# Altium schematic symbol library TI Power Management Shunt Voltage Reference.SchLib: 1526 symbols (part 7 of 18) (continued)
## LT1009CPWR
designator U?
Integrated Reference Circuit, 2.5 V, 15 ppm / degC, 10 mA, 0 to 70 degC, 8-pin TSSOP (PW), Green (RoHS & no Sb/Br); Manufacturer: Texas Instruments; PartNumber: LT1009CPWR; Initial Accuracy @ 25/deg C(%): 0.2; Iout/Iz(Max)(mA): 10; Min Iz for Regulation(uA): 400; Rating: Catalog; SubFamily: Shunt Voltage Reference; Temp Coeff(Max)(ppm/ degree C): 25; Temp Coeff(Typ)(ppm/ degree C): 15; VO(V): 2.5; DatasheetVersion: SLVS013N; PackageVersion: 4040064-2/G; PackageReference: PW8; PackageDescription: 8-Pin Plastic Small Outline, Body 4.4 x 3 mm, Pitch 0.65 mm; Supplier 1: Digi-Key; Supplier Part Number 1: 296-13081-2-ND; Supplier 2: Digi-Key; Supplier Part Number 2: 296-13081-1-ND; Supplier 3: Digi-Key; Supplier Part Number 3: 296-13081-6-ND; Supplier 4: Newark; Supplier Part Number 4: 75C0928; Supplier 5: Mouser; Supplier Part Number 5: 595-LT1009CPWR; Eco-Plan: Green (RoHS & no Sb/Br); Mounting Technology: Surface Mount; Code_JEDEC: MO-153; ComponentLink1Description: Manufacturer URL; ComponentLink1URL: http://www.ti.com/; ComponentLink2Description: Datasheet; ComponentLink2URL: http://www.ti.com/general/docs/lit/getliterature.tsp?genericPartNumber=LT1009&fileType=pdf; ComponentLink3Description: Package Specification; ComponentLink3URL: http://www.ti.com/litv/pdf/mtss001d
footprint TI-PW8_N (SOP, 8-Leads, Body 4.4x3mm, Pitch 0.65mm, IPC Medium Density)
part A pins: 4 ANODE, 5 ADJ (in), 6 CATHODE, 8 CATHODE
part B pins: 1 NC "No internal connection", 2 NC "No internal connection", 3 NC "No internal connection", 7 NC "No internal connection"

## LT1009CPWRE4
designator U?
Integrated Reference Circuit, 2.5 V, 15 ppm / degC, 10 mA, 0 to 70 degC, 8-pin TSSOP (PW), Green (RoHS & no Sb/Br); Manufacturer: Texas Instruments; PartNumber: LT1009CPWRE4; Initial Accuracy @ 25/deg C(%): 0.2; Iout/Iz(Max)(mA): 10; Min Iz for Regulation(uA): 400; Rating: Catalog; SubFamily: Shunt Voltage Reference; Temp Coeff(Max)(ppm/ degree C): 25; Temp Coeff(Typ)(ppm/ degree C): 15; VO(V): 2.5; DatasheetVersion: SLVS013N; PackageVersion: 4040064-2/G; PackageReference: PW8; PackageDescription: 8-Pin Plastic Small Outline, Body 4.4 x 3 mm, Pitch 0.65 mm; Supplier 1: Digi-Key; Supplier Part Number 1: LT1009CPWRE4-ND; Supplier 2: Mouser; Supplier Part Number 2: 595-LT1009CPWRE4; Eco-Plan: Green (RoHS & no Sb/Br); Mounting Technology: Surface Mount; Code_JEDEC: MO-153; ComponentLink1Description: Manufacturer URL; ComponentLink1URL: http://www.ti.com/; ComponentLink2Description: Datasheet; ComponentLink2URL: http://www.ti.com/general/docs/lit/getliterature.tsp?genericPartNumber=LT1009&fileType=pdf; ComponentLink3Description: Package Specification; ComponentLink3URL: http://www.ti.com/litv/pdf/mtss001d
footprint TI-PW8_N (SOP, 8-Leads, Body 4.4x3mm, Pitch 0.65mm, IPC Medium Density)
part A pins: 4 ANODE, 5 ADJ (in), 6 CATHODE, 8 CATHODE
part B pins: 1 NC "No internal connection", 2 NC "No internal connection", 3 NC "No internal connection", 7 NC "No internal connection"

## LT1009CPWRG4
designator U?
Integrated Reference Circuit, 2.5 V, 15 ppm / degC, 10 mA, 0 to 70 degC, 8-pin TSSOP (PW), Green (RoHS & no Sb/Br); Manufacturer: Texas Instruments; PartNumber: LT1009CPWRG4; Initial Accuracy @ 25/deg C(%): 0.2; Iout/Iz(Max)(mA): 10; Min Iz for Regulation(uA): 400; Rating: Catalog; SubFamily: Shunt Voltage Reference; Temp Coeff(Max)(ppm/ degree C): 25; Temp Coeff(Typ)(ppm/ degree C): 15; VO(V): 2.5; DatasheetVersion: SLVS013N; PackageVersion: 4040064-2/G; PackageReference: PW8; PackageDescription: 8-Pin Plastic Small Outline, Body 4.4 x 3 mm, Pitch 0.65 mm; Supplier 1: Digi-Key; Supplier Part Number 1: LT1009CPWRG4-ND; Supplier 2: Newark; Supplier Part Number 2: 46M6619; Supplier 3: Mouser; Supplier Part Number 3: 595-LT1009CPWRG4; Eco-Plan: Green (RoHS & no Sb/Br); Mounting Technology: Surface Mount; Code_JEDEC: MO-153; ComponentLink1Description: Manufacturer URL; ComponentLink1URL: http://www.ti.com/; ComponentLink2Description: Datasheet; ComponentLink2URL: http://www.ti.com/general/docs/lit/getliterature.tsp?genericPartNumber=LT1009&fileType=pdf; ComponentLink3Description: Package Specification; ComponentLink3URL: http://www.ti.com/litv/pdf/mtss001d
footprint TI-PW8_N (SOP, 8-Leads, Body 4.4x3mm, Pitch 0.65mm, IPC Medium Density)
part A pins: 4 ANODE, 5 ADJ (in), 6 CATHODE, 8 CATHODE
part B pins: 1 NC "No internal connection", 2 NC "No internal connection", 3 NC "No internal connection", 7 NC "No internal connection"

## LT1009ID
designator U?
Integrated Reference Circuit, 2.5 V, 15 ppm / degC, 10 mA, -40 to 85 degC, 8-pin SOIC (D), Green (RoHS & no Sb/Br); Manufacturer: Texas Instruments; PartNumber: LT1009ID; Initial Accuracy @ 25/deg C(%): 0.2; Iout/Iz(Max)(mA): 10; Min Iz for Regulation(uA): 400; Rating: Catalog; SubFamily: Shunt Voltage Reference; Temp Coeff(Max)(ppm/ degree C): 25; Temp Coeff(Typ)(ppm/ degree C): 15; VO(V): 2.5; DatasheetVersion: SLVS013N; PackageVersion: 4040047-3/M; PackageReference: D8; PackageDescription: 8-Pin Plastic Small Outline, Body 4.9 x 3.9 mm, Pitch 1.27 mm; Supplier 1: Digi-Key; Supplier Part Number 1: 296-9586-5-ND; Supplier 2: Farnell; Supplier Part Number 2: 9589732; Supplier 3: Newark; Supplier Part Number 3: 97K3908; Supplier 4: Newark; Supplier Part Number 4: 75C0929; Supplier 5: Mouser; Supplier Part Number 5: 595-LT1009ID; Eco-Plan: Green (RoHS & no Sb/Br); Mounting Technology: Surface Mount; Code_JEDEC: MS-012; ComponentLink1Description: Manufacturer URL; ComponentLink1URL: http://www.ti.com/; ComponentLink2Description: Datasheet; ComponentLink2URL: http://www.ti.com/general/docs/lit/getliterature.tsp?genericPartNumber=LT1009&fileType=pdf; ComponentLink3Description: Package Specification; ComponentLink3URL: http://www.ti.com/litv/pdf/msoi002j
footprint TI-D8_N (SOIC, 8-Leads, Body 4.9x3.9mm, Pitch 1.27mm, IPC Medium Density)
part A pins: 4 ANODE, 5 ADJ (in), 6 CATHODE, 8 CATHODE
part B pins: 1 NC, 2 NC, 3 NC, 7 NC

## LT1009IDE4
designator U?
Integrated Reference Circuit, 2.5 V, 15 ppm / degC, 10 mA, -40 to 85 degC, 8-pin SOIC (D), Green (RoHS & no Sb/Br); Manufacturer: Texas Instruments; PartNumber: LT1009IDE4; Initial Accuracy @ 25/deg C(%): 0.2; Iout/Iz(Max)(mA): 10; Min Iz for Regulation(uA): 400; Rating: Catalog; SubFamily: Shunt Voltage Reference; Temp Coeff(Max)(ppm/ degree C): 25; Temp Coeff(Typ)(ppm/ degree C): 15; VO(V): 2.5; DatasheetVersion: SLVS013N; PackageVersion: 4040047-3/M; PackageReference: D8; PackageDescription: 8-Pin Plastic Small Outline, Body 4.9 x 3.9 mm, Pitch 1.27 mm; Supplier 1: Digi-Key; Supplier Part Number 1: LT1009IDE4-ND; Supplier 2: Mouser; Supplier Part Number 2: 595-LT1009IDE4; Eco-Plan: Green (RoHS & no Sb/Br); Mounting Technology: Surface Mount; Code_JEDEC: MS-012; ComponentLink1Description: Manufacturer URL; ComponentLink1URL: http://www.ti.com/; ComponentLink2Description: Datasheet; ComponentLink2URL: http://www.ti.com/general/docs/lit/getliterature.tsp?genericPartNumber=LT1009&fileType=pdf; ComponentLink3Description: Package Specification; ComponentLink3URL: http://www.ti.com/litv/pdf/msoi002j
footprint TI-D8_N (SOIC, 8-Leads, Body 4.9x3.9mm, Pitch 1.27mm, IPC Medium Density)
part A pins: 4 ANODE, 5 ADJ (in), 6 CATHODE, 8 CATHODE
part B pins: 1 NC, 2 NC, 3 NC, 7 NC

## LT1009IDG4
designator U?
Integrated Reference Circuit, 2.5 V, 15 ppm / degC, 10 mA, -40 to 85 degC, 8-pin SOIC (D), Green (RoHS & no Sb/Br); Manufacturer: Texas Instruments; PartNumber: LT1009IDG4; Initial Accuracy @ 25/deg C(%): 0.2; Iout/Iz(Max)(mA): 10; Min Iz for Regulation(uA): 400; Rating: Catalog; SubFamily: Shunt Voltage Reference; Temp Coeff(Max)(ppm/ degree C): 25; Temp Coeff(Typ)(ppm/ degree C): 15; VO(V): 2.5; DatasheetVersion: SLVS013N; PackageVersion: 4040047-3/M; PackageReference: D8; PackageDescription: 8-Pin Plastic Small Outline, Body 4.9 x 3.9 mm, Pitch 1.27 mm; Supplier 1: Digi-Key; Supplier Part Number 1: LT1009IDG4-ND; Supplier 2: Newark; Supplier Part Number 2: 41M3496; Supplier 3: Mouser; Supplier Part Number 3: 595-LT1009IDG4; Eco-Plan: Green (RoHS & no Sb/Br); Mounting Technology: Surface Mount; Code_JEDEC: MS-012; ComponentLink1Description: Manufacturer URL; ComponentLink1URL: http://www.ti.com/; ComponentLink2Description: Datasheet; ComponentLink2URL: http://www.ti.com/general/docs/lit/getliterature.tsp?genericPartNumber=LT1009&fileType=pdf; ComponentLink3Description: Package Specification; ComponentLink3URL: http://www.ti.com/litv/pdf/msoi002j
footprint TI-D8_N (SOIC, 8-Leads, Body 4.9x3.9mm, Pitch 1.27mm, IPC Medium Density)
part A pins: 4 ANODE, 5 ADJ (in), 6 CATHODE, 8 CATHODE
part B pins: 1 NC, 2 NC, 3 NC, 7 NC

## LT1009IDR
designator U?
Integrated Reference Circuit, 2.5 V, 15 ppm / degC, 10 mA, -40 to 85 degC, 8-pin SOIC (D), Green (RoHS & no Sb/Br); Manufacturer: Texas Instruments; PartNumber: LT1009IDR; Initial Accuracy @ 25/deg C(%): 0.2; Iout/Iz(Max)(mA): 10; Min Iz for Regulation(uA): 400; Rating: Catalog; SubFamily: Shunt Voltage Reference; Temp Coeff(Max)(ppm/ degree C): 25; Temp Coeff(Typ)(ppm/ degree C): 15; VO(V): 2.5; DatasheetVersion: SLVS013N; PackageVersion: 4040047-3/M; PackageReference: D8; PackageDescription: 8-Pin Plastic Small Outline, Body 4.9 x 3.9 mm, Pitch 1.27 mm; Supplier 1: Digi-Key; Supplier Part Number 1: 296-14613-2-ND; Supplier 2: Digi-Key; Supplier Part Number 2: 296-14613-1-ND; Supplier 3: Digi-Key; Supplier Part Number 3: 296-14613-6-ND; Supplier 4: Newark; Supplier Part Number 4: 75C0930; Supplier 5: Mouser; Supplier Part Number 5: 595-LT1009IDR; Eco-Plan: Green (RoHS & no Sb/Br); Mounting Technology: Surface Mount; Code_JEDEC: MS-012; ComponentLink1Description: Manufacturer URL; ComponentLink1URL: http://www.ti.com/; ComponentLink2Description: Datasheet; ComponentLink2URL: http://www.ti.com/general/docs/lit/getliterature.tsp?genericPartNumber=LT1009&fileType=pdf; ComponentLink3Description: Package Specification; ComponentLink3URL: http://www.ti.com/litv/pdf/msoi002j
footprint TI-D8_N (SOIC, 8-Leads, Body 4.9x3.9mm, Pitch 1.27mm, IPC Medium Density)
part A pins: 4 ANODE, 5 ADJ (in), 6 CATHODE, 8 CATHODE
part B pins: 1 NC, 2 NC, 3 NC, 7 NC

## LT1009IDRE4
designator U?
Integrated Reference Circuit, 2.5 V, 15 ppm / degC, 10 mA, -40 to 85 degC, 8-pin SOIC (D), Green (RoHS & no Sb/Br); Manufacturer: Texas Instruments; PartNumber: LT1009IDRE4; Initial Accuracy @ 25/deg C(%): 0.2; Iout/Iz(Max)(mA): 10; Min Iz for Regulation(uA): 400; Rating: Catalog; SubFamily: Shunt Voltage Reference; Temp Coeff(Max)(ppm/ degree C): 25; Temp Coeff(Typ)(ppm/ degree C): 15; VO(V): 2.5; DatasheetVersion: SLVS013N; PackageVersion: 4040047-3/M; PackageReference: D8; PackageDescription: 8-Pin Plastic Small Outline, Body 4.9 x 3.9 mm, Pitch 1.27 mm; Supplier 1: Digi-Key; Supplier Part Number 1: LT1009IDRE4-ND; Supplier 2: Mouser; Supplier Part Number 2: 595-LT1009IDRE4; Eco-Plan: Green (RoHS & no Sb/Br); Mounting Technology: Surface Mount; Code_JEDEC: MS-012; ComponentLink1Description: Manufacturer URL; ComponentLink1URL: http://www.ti.com/; ComponentLink2Description: Datasheet; ComponentLink2URL: http://www.ti.com/general/docs/lit/getliterature.tsp?genericPartNumber=LT1009&fileType=pdf; ComponentLink3Description: Package Specification; ComponentLink3URL: http://www.ti.com/litv/pdf/msoi002j
footprint TI-D8_N (SOIC, 8-Leads, Body 4.9x3.9mm, Pitch 1.27mm, IPC Medium Density)
part A pins: 4 ANODE, 5 ADJ (in), 6 CATHODE, 8 CATHODE
part B pins: 1 NC, 2 NC, 3 NC, 7 NC

## LT1009IDRG4
designator U?
Integrated Reference Circuit, 2.5 V, 15 ppm / degC, 10 mA, -40 to 85 degC, 8-pin SOIC (D), Green (RoHS & no Sb/Br); Manufacturer: Texas Instruments; PartNumber: LT1009IDRG4; Initial Accuracy @ 25/deg C(%): 0.2; Iout/Iz(Max)(mA): 10; Min Iz for Regulation(uA): 400; Rating: Catalog; SubFamily: Shunt Voltage Reference; Temp Coeff(Max)(ppm/ degree C): 25; Temp Coeff(Typ)(ppm/ degree C): 15; VO(V): 2.5; DatasheetVersion: SLVS013N; PackageVersion: 4040047-3/M; PackageReference: D8; PackageDescription: 8-Pin Plastic Small Outline, Body 4.9 x 3.9 mm, Pitch 1.27 mm; Supplier 1: Digi-Key; Supplier Part Number 1: LT1009IDRG4-ND; Supplier 2: Newark; Supplier Part Number 2: 41M3497; Supplier 3: Mouser; Supplier Part Number 3: 595-LT1009IDRG4; Eco-Plan: Green (RoHS & no Sb/Br); Mounting Technology: Surface Mount; Code_JEDEC: MS-012; ComponentLink1Description: Manufacturer URL; ComponentLink1URL: http://www.ti.com/; ComponentLink2Description: Datasheet; ComponentLink2URL: http://www.ti.com/general/docs/lit/getliterature.tsp?genericPartNumber=LT1009&fileType=pdf; ComponentLink3Description: Package Specification; ComponentLink3URL: http://www.ti.com/litv/pdf/msoi002j
footprint TI-D8_N (SOIC, 8-Leads, Body 4.9x3.9mm, Pitch 1.27mm, IPC Medium Density)
part A pins: 4 ANODE, 5 ADJ (in), 6 CATHODE, 8 CATHODE
part B pins: 1 NC, 2 NC, 3 NC, 7 NC

## LT1009ILP
designator U?
Integrated Reference Circuit, 2.5 V, 15 ppm / degC, 10 mA, -40 to 85 degC, 3-pin TO-92 (LP), Pb-Free (RoHS); Manufacturer: Texas Instruments; PartNumber: LT1009ILP; Initial Accuracy @ 25/deg C(%): 0.2; Iout/Iz(Max)(mA): 10; Min Iz for Regulation(uA): 400; Rating: Catalog; SubFamily: Shunt Voltage Reference; Temp Coeff(Max)(ppm/ degree C): 25; Temp Coeff(Typ)(ppm/ degree C): 15; VO(V): 2.5; DatasheetVersion: SLVS013N; PackageVersion: 4040001-2/C; PackageReference: LP3; PackageDescription: Plastic Cylindrical Package, Formed Lead Option (TO-92); Supplier 1: Digi-Key; Supplier Part Number 1: 296-9587-5-ND; Supplier 2: Newark; Supplier Part Number 2: 75C0931; Supplier 3: Mouser; Supplier Part Number 3: 595-LT1009ILP; Eco-Plan: Pb-Free (RoHS); Mounting Technology: Through Hole; Code_JEDEC: TO-226; ComponentLink1Description: Manufacturer URL; ComponentLink1URL: http://www.ti.com/; ComponentLink2Description: Datasheet; ComponentLink2URL: http://www.ti.com/general/docs/lit/getliterature.tsp?genericPartNumber=LT1009&fileType=pdf; ComponentLink3Description: Package Specification; ComponentLink3URL: http://www.ti.com/litv/pdf/msot002a
footprint TI-LP3 (TO, Flat Index; 3 In-Line, Formed Axial Leads; Body Dia. 4.8mm; Leads 0.56 x 0.41 mm (max))
pins: 1 ADJ (in), 2 CATHODE, 3 ANODE

## LT1009ILPE3
designator U?
Integrated Reference Circuit, 2.5 V, 15 ppm / degC, 10 mA, -40 to 85 degC, 3-pin TO-92 (LP), Pb-Free (RoHS); Manufacturer: Texas Instruments; PartNumber: LT1009ILPE3; Initial Accuracy @ 25/deg C(%): 0.2; Iout/Iz(Max)(mA): 10; Min Iz for Regulation(uA): 400; Rating: Catalog; SubFamily: Shunt Voltage Reference; Temp Coeff(Max)(ppm/ degree C): 25; Temp Coeff(Typ)(ppm/ degree C): 15; VO(V): 2.5; DatasheetVersion: SLVS013N; PackageVersion: 4040001-2/C; PackageReference: LP3; PackageDescription: Plastic Cylindrical Package, Formed Lead Option (TO-92); Supplier 1: Digi-Key; Supplier Part Number 1: LT1009ILPE3-ND; Supplier 2: Newark; Supplier Part Number 2: 66K2468; Supplier 3: Mouser; Supplier Part Number 3: 595-LT1009ILPE3; Eco-Plan: Pb-Free (RoHS); Mounting Technology: Through Hole; Code_JEDEC: TO-226; ComponentLink1Description: Manufacturer URL; ComponentLink1URL: http://www.ti.com/; ComponentLink2Description: Datasheet; ComponentLink2URL: http://www.ti.com/general/docs/lit/getliterature.tsp?genericPartNumber=LT1009&fileType=pdf; ComponentLink3Description: Package Specification; ComponentLink3URL: http://www.ti.com/litv/pdf/msot002a
footprint TI-LP3 (TO, Flat Index; 3 In-Line, Formed Axial Leads; Body Dia. 4.8mm; Leads 0.56 x 0.41 mm (max))
pins: 1 ADJ (in), 2 CATHODE, 3 ANODE

## LT1009ILPR
designator U?
Integrated Reference Circuit, 2.5 V, 15 ppm / degC, 10 mA, -40 to 85 degC, 3-pin TO-92 (LP), Pb-Free (RoHS); Manufacturer: Texas Instruments; PartNumber: LT1009ILPR; Initial Accuracy @ 25/deg C(%): 0.2; Iout/Iz(Max)(mA): 10; Min Iz for Regulation(uA): 400; Rating: Catalog; SubFamily: Shunt Voltage Reference; Temp Coeff(Max)(ppm/ degree C): 25; Temp Coeff(Typ)(ppm/ degree C): 15; VO(V): 2.5; DatasheetVersion: SLVS013N; PackageVersion: 4040001-2/C; PackageReference: LP3; PackageDescription: Plastic Cylindrical Package, Formed Lead Option (TO-92); Supplier 1: Digi-Key; Supplier Part Number 1: 296-14614-2-ND; Supplier 2: Digi-Key; Supplier Part Number 2: 296-14614-1-ND; Supplier 3: Digi-Key; Supplier Part Number 3: 296-14614-6-ND; Supplier 4: Newark; Supplier Part Number 4: 75C0932; Supplier 5: Mouser; Supplier Part Number 5: 595-LT1009ILPR; Eco-Plan: Pb-Free (RoHS); Mounting Technology: Through Hole; Code_JEDEC: TO-226; ComponentLink1Description: Manufacturer URL; ComponentLink1URL: http://www.ti.com/; ComponentLink2Description: Datasheet; ComponentLink2URL: http://www.ti.com/general/docs/lit/getliterature.tsp?genericPartNumber=LT1009&fileType=pdf; ComponentLink3Description: Package Specification; ComponentLink3URL: http://www.ti.com/litv/pdf/msot002a
footprint TI-LP3 (TO, Flat Index; 3 In-Line, Formed Axial Leads; Body Dia. 4.8mm; Leads 0.56 x 0.41 mm (max))
pins: 1 ADJ (in), 2 CATHODE, 3 ANODE

## LT1009ILPRE3
designator U?
Integrated Reference Circuit, 2.5 V, 15 ppm / degC, 10 mA, -40 to 85 degC, 3-pin TO-92 (LP), Pb-Free (RoHS); Manufacturer: Texas Instruments; PartNumber: LT1009ILPRE3; Initial Accuracy @ 25/deg C(%): 0.2; Iout/Iz(Max)(mA): 10; Min Iz for Regulation(uA): 400; Rating: Catalog; SubFamily: Shunt Voltage Reference; Temp Coeff(Max)(ppm/ degree C): 25; Temp Coeff(Typ)(ppm/ degree C): 15; VO(V): 2.5; DatasheetVersion: SLVS013N; PackageVersion: 4040001-2/C; PackageReference: LP3; PackageDescription: Plastic Cylindrical Package, Formed Lead Option (TO-92); Supplier 1: Digi-Key; Supplier Part Number 1: LT1009ILPRE3-ND; Supplier 2: Mouser; Supplier Part Number 2: 595-LT1009ILPRE3; Eco-Plan: Pb-Free (RoHS); Mounting Technology: Through Hole; Code_JEDEC: TO-226; ComponentLink1Description: Manufacturer URL; ComponentLink1URL: http://www.ti.com/; ComponentLink2Description: Datasheet; ComponentLink2URL: http://www.ti.com/general/docs/lit/getliterature.tsp?genericPartNumber=LT1009&fileType=pdf; ComponentLink3Description: Package Specification; ComponentLink3URL: http://www.ti.com/litv/pdf/msot002a
footprint TI-LP3 (TO, Flat Index; 3 In-Line, Formed Axial Leads; Body Dia. 4.8mm; Leads 0.56 x 0.41 mm (max))
pins: 1 ADJ (in), 2 CATHODE, 3 ANODE

## LT1009IPWR
designator U?
Integrated Reference Circuit, 2.5 V, 15 ppm / degC, 10 mA, -40 to 85 degC, 8-pin TSSOP (PW), Green (RoHS & no Sb/Br); Manufacturer: Texas Instruments; PartNumber: LT1009IPWR; Initial Accuracy @ 25/deg C(%): 0.2; Iout/Iz(Max)(mA): 10; Min Iz for Regulation(uA): 400; Rating: Catalog; SubFamily: Shunt Voltage Reference; Temp Coeff(Max)(ppm/ degree C): 25; Temp Coeff(Typ)(ppm/ degree C): 15; VO(V): 2.5; DatasheetVersion: SLVS013N; PackageVersion: 4040064-2/G; PackageReference: PW8; PackageDescription: 8-Pin Plastic Small Outline, Body 4.4 x 3 mm, Pitch 0.65 mm; Supplier 1: Digi-Key; Supplier Part Number 1: 296-15734-2-ND; Supplier 2: Digi-Key; Supplier Part Number 2: 296-15734-1-ND; Supplier 3: Digi-Key; Supplier Part Number 3: 296-15734-6-ND; Supplier 4: Mouser; Supplier Part Number 4: 595-LT1009IPWR; Eco-Plan: Green (RoHS & no Sb/Br); Mounting Technology: Surface Mount; Code_JEDEC: MO-153; ComponentLink1Description: Manufacturer URL; ComponentLink1URL: http://www.ti.com/; ComponentLink2Description: Datasheet; ComponentLink2URL: http://www.ti.com/general/docs/lit/getliterature.tsp?genericPartNumber=LT1009&fileType=pdf; ComponentLink3Description: Package Specification; ComponentLink3URL: http://www.ti.com/litv/pdf/mtss001d
footprint TI-PW8_N (SOP, 8-Leads, Body 4.4x3mm, Pitch 0.65mm, IPC Medium Density)
part A pins: 4 ANODE, 5 ADJ (in), 6 CATHODE, 8 CATHODE
part B pins: 1 NC "No internal connection", 2 NC "No internal connection", 3 NC "No internal connection", 7 NC "No internal connection"

## LT1009IPWRE4
designator U?
Integrated Reference Circuit, 2.5 V, 15 ppm / degC, 10 mA, -40 to 85 degC, 8-pin TSSOP (PW), Green (RoHS & no Sb/Br); Manufacturer: Texas Instruments; PartNumber: LT1009IPWRE4; Initial Accuracy @ 25/deg C(%): 0.2; Iout/Iz(Max)(mA): 10; Min Iz for Regulation(uA): 400; Rating: Catalog; SubFamily: Shunt Voltage Reference; Temp Coeff(Max)(ppm/ degree C): 25; Temp Coeff(Typ)(ppm/ degree C): 15; VO(V): 2.5; DatasheetVersion: SLVS013N; PackageVersion: 4040064-2/G; PackageReference: PW8; PackageDescription: 8-Pin Plastic Small Outline, Body 4.4 x 3 mm, Pitch 0.65 mm; Supplier 1: Digi-Key; Supplier Part Number 1: LT1009IPWRE4-ND; Supplier 2: Mouser; Supplier Part Number 2: 595-LT1009IPWRE4; Eco-Plan: Green (RoHS & no Sb/Br); Mounting Technology: Surface Mount; Code_JEDEC: MO-153; ComponentLink1Description: Manufacturer URL; ComponentLink1URL: http://www.ti.com/; ComponentLink2Description: Datasheet; ComponentLink2URL: http://www.ti.com/general/docs/lit/getliterature.tsp?genericPartNumber=LT1009&fileType=pdf; ComponentLink3Description: Package Specification; ComponentLink3URL: http://www.ti.com/litv/pdf/mtss001d
footprint TI-PW8_N (SOP, 8-Leads, Body 4.4x3mm, Pitch 0.65mm, IPC Medium Density)
part A pins: 4 ANODE, 5 ADJ (in), 6 CATHODE, 8 CATHODE
part B pins: 1 NC "No internal connection", 2 NC "No internal connection", 3 NC "No internal connection", 7 NC "No internal connection"

## LT1009IPWRG4
designator U?
Integrated Reference Circuit, 2.5 V, 15 ppm / degC, 10 mA, -40 to 85 degC, 8-pin TSSOP (PW), Green (RoHS & no Sb/Br); Manufacturer: Texas Instruments; PartNumber: LT1009IPWRG4; Initial Accuracy @ 25/deg C(%): 0.2; Iout/Iz(Max)(mA): 10; Min Iz for Regulation(uA): 400; Rating: Catalog; SubFamily: Shunt Voltage Reference; Temp Coeff(Max)(ppm/ degree C): 25; Temp Coeff(Typ)(ppm/ degree C): 15; VO(V): 2.5; DatasheetVersion: SLVS013N; PackageVersion: 4040064-2/G; PackageReference: PW8; PackageDescription: 8-Pin Plastic Small Outline, Body 4.4 x 3 mm, Pitch 0.65 mm; Supplier 1: Digi-Key; Supplier Part Number 1: LT1009IPWRG4-ND; Supplier 2: Mouser; Supplier Part Number 2: 595-LT1009IPWRG4; Eco-Plan: Green (RoHS & no Sb/Br); Mounting Technology: Surface Mount; Code_JEDEC: MO-153; ComponentLink1Description: Manufacturer URL; ComponentLink1URL: http://www.ti.com/; ComponentLink2Description: Datasheet; ComponentLink2URL: http://www.ti.com/general/docs/lit/getliterature.tsp?genericPartNumber=LT1009&fileType=pdf; ComponentLink3Description: Package Specification; ComponentLink3URL: http://www.ti.com/litv/pdf/mtss001d; ComponentLink4Description: URL Link1; ComponentLink4URL: Samples URL:http://www.ti.com/product/lt1009
footprint TI-PW8_N (SOP, 8-Leads, Body 4.4x3mm, Pitch 0.65mm, IPC Medium Density)
part A pins: 4 ANODE, 5 ADJ (in), 6 CATHODE, 8 CATHODE
part B pins: 1 NC "No internal connection", 2 NC "No internal connection", 3 NC "No internal connection", 7 NC "No internal connection"

## REF1004C-1.2
designator U?
Micropower Voltage Reference, 1.235 V, 20 ppm / degC, 20 mA, 0 to 70 degC, 8-pin SOIC (D), Green (RoHS & no Sb/Br); Manufacturer: Texas Instruments; PartNumber: REF1004C-1.2; Initial Accuracy @ 25/deg C(%): 0.3; Iout/Iz(Max)(mA): 20; Min Iz for Regulation(uA): 10; Rating: Catalog; SubFamily: Shunt Voltage Reference; VO(V): 1.235; DatasheetVersion: SBVS002; PackageVersion: 4040047-3/M; PackageReference: D8; PackageDescription: 8-Pin Plastic Small Outline, Body 4.9 x 3.9 mm, Pitch 1.27 mm; Supplier 1: Digi-Key; Supplier Part Number 1: REF1004C-1.2-ND; Supplier 2: Newark; Supplier Part Number 2: 75C7399; Supplier 3: Mouser; Supplier Part Number 3: 595-REF1004C-1.2; Eco-Plan: Green (RoHS & no Sb/Br); Temp Coeff(Typ)(ppm/ degree C): 20; Mounting Technology: Surface Mount; Code_JEDEC: MS-012; ComponentLink1Description: Manufacturer URL; ComponentLink1URL: http://www.ti.com/; ComponentLink2Description: Datasheet; ComponentLink2URL: http://www.ti.com/general/docs/lit/getliterature.tsp?genericPartNumber=REF1004-1.2&fileType=pdf; ComponentLink3Description: Package Specification; ComponentLink3URL: http://www.ti.com/litv/pdf/msoi002j
footprint TI-D8_N (SOIC, 8-Leads, Body 4.9x3.9mm, Pitch 1.27mm, IPC Medium Density)
part A pins: 4 ANODE, 6 CATHODE, 8 CATHODE
part B pins: 1 NC, 2 NC, 3 NC, 5 NC, 7 NC

## REF1004C-1.2/2K5
designator U?
Micropower Voltage Reference, 1.235 V, 20 ppm / degC, 20 mA, 0 to 70 degC, 8-pin SOIC (D), Green (RoHS & no Sb/Br); Manufacturer: Texas Instruments; PartNumber: REF1004C-1.2/2K5; Initial Accuracy @ 25/deg C(%): 0.3; Iout/Iz(Max)(mA): 20; Min Iz for Regulation(uA): 10; Rating: Catalog; SubFamily: Shunt Voltage Reference; VO(V): 1.235; DatasheetVersion: SBVS002; PackageVersion: 4040047-3/M; PackageReference: D8; PackageDescription: 8-Pin Plastic Small Outline, Body 4.9 x 3.9 mm, Pitch 1.27 mm; Supplier 1: Digi-Key; Supplier Part Number 1: REF1004C-1.2/2K5-ND; Supplier 2: Mouser; Supplier Part Number 2: 595-REF1004C-1.2/2K5; Eco-Plan: Green (RoHS & no Sb/Br); Temp Coeff(Typ)(ppm/ degree C): 20; Mounting Technology: Surface Mount; Code_JEDEC: MS-012; ComponentLink1Description: Manufacturer URL; ComponentLink1URL: http://www.ti.com/; ComponentLink2Description: Datasheet; ComponentLink2URL: http://www.ti.com/general/docs/lit/getliterature.tsp?genericPartNumber=REF1004-1.2&fileType=pdf; ComponentLink3Description: Package Specification; ComponentLink3URL: http://www.ti.com/litv/pdf/msoi002j
footprint TI-D8_N (SOIC, 8-Leads, Body 4.9x3.9mm, Pitch 1.27mm, IPC Medium Density)
part A pins: 4 ANODE, 6 CATHODE, 8 CATHODE
part B pins: 1 NC, 2 NC, 3 NC, 5 NC, 7 NC

## REF1004C-1.2/2K5E4
designator U?
Micropower Voltage Reference, 1.235 V, 20 ppm / degC, 20 mA, 0 to 70 degC, 8-pin SOIC (D), Green (RoHS & no Sb/Br); Manufacturer: Texas Instruments; PartNumber: REF1004C-1.2/2K5E4; Initial Accuracy @ 25/deg C(%): 0.3; Iout/Iz(Max)(mA): 20; Min Iz for Regulation(uA): 10; Rating: Catalog; SubFamily: Shunt Voltage Reference; VO(V): 1.235; DatasheetVersion: SBVS002; PackageVersion: 4040047-3/M; PackageReference: D8; PackageDescription: 8-Pin Plastic Small Outline, Body 4.9 x 3.9 mm, Pitch 1.27 mm; Supplier 1: Digi-Key; Supplier Part Number 1: REF1004C-1.2/2K5E4-ND; Supplier 2: Newark; Supplier Part Number 2: 28M6734; Supplier 3: Mouser; Supplier Part Number 3: 595-REF1004C122K5E4; Eco-Plan: Green (RoHS & no Sb/Br); Temp Coeff(Typ)(ppm/ degree C): 20; Mounting Technology: Surface Mount; Code_JEDEC: MS-012; ComponentLink1Description: Manufacturer URL; ComponentLink1URL: http://www.ti.com/; ComponentLink2Description: Datasheet; ComponentLink2URL: http://www.ti.com/general/docs/lit/getliterature.tsp?genericPartNumber=REF1004-1.2&fileType=pdf; ComponentLink3Description: Package Specification; ComponentLink3URL: http://www.ti.com/litv/pdf/msoi002j
footprint TI-D8_N (SOIC, 8-Leads, Body 4.9x3.9mm, Pitch 1.27mm, IPC Medium Density)
part A pins: 4 ANODE, 6 CATHODE, 8 CATHODE
part B pins: 1 NC, 2 NC, 3 NC, 5 NC, 7 NC

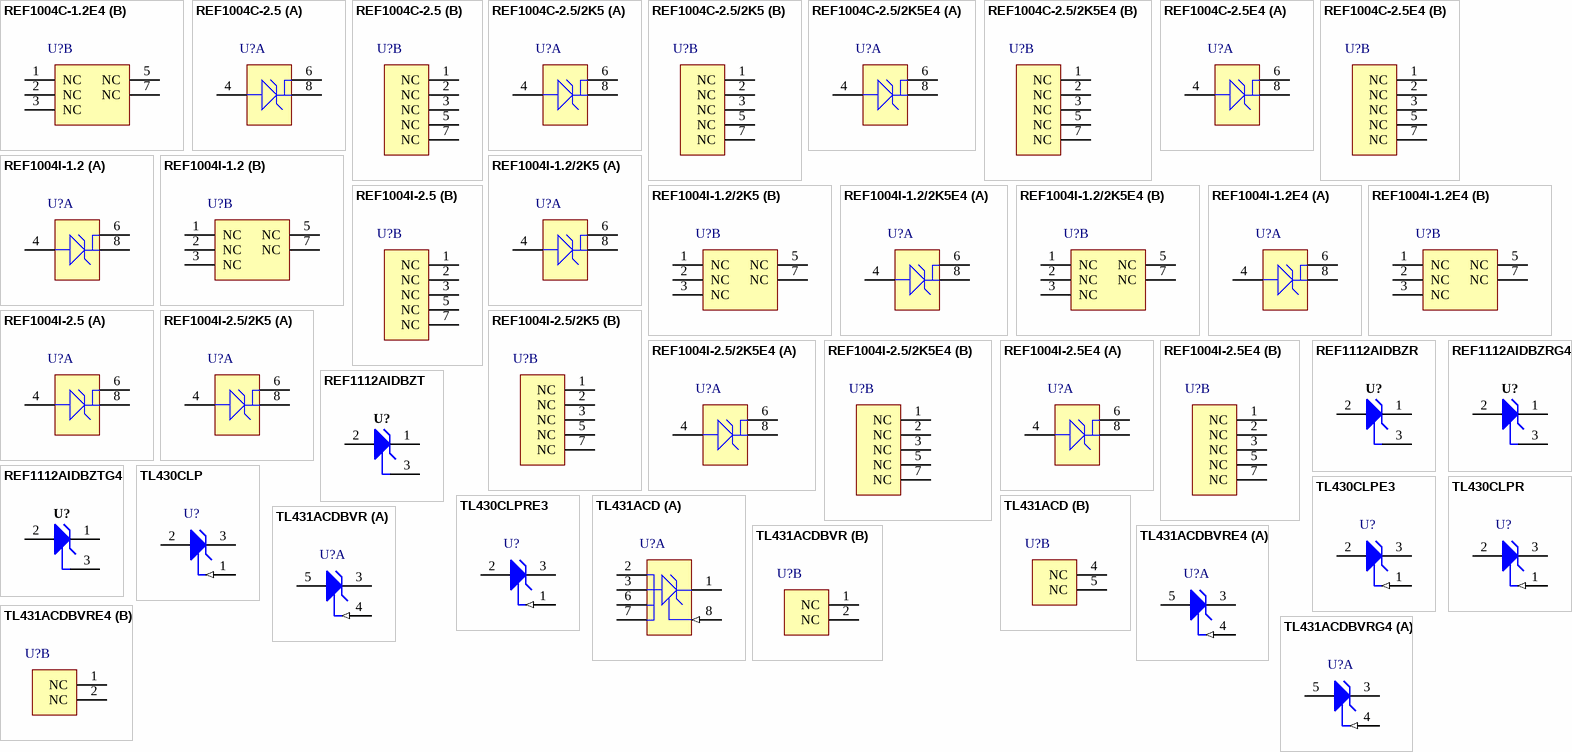
[diagram p21: symbols REF1004C-1.2E4 to TL431ACDBVRG4]

## REF1004C-1.2E4
designator U?
Micropower Voltage Reference, 1.235 V, 20 ppm / degC, 20 mA, 0 to 70 degC, 8-pin SOIC (D), Green (RoHS & no Sb/Br); Manufacturer: Texas Instruments; PartNumber: REF1004C-1.2E4; Initial Accuracy @ 25/deg C(%): 0.3; Iout/Iz(Max)(mA): 20; Min Iz for Regulation(uA): 10; Rating: Catalog; SubFamily: Shunt Voltage Reference; VO(V): 1.235; DatasheetVersion: SBVS002; PackageVersion: 4040047-3/M; PackageReference: D8; PackageDescription: 8-Pin Plastic Small Outline, Body 4.9 x 3.9 mm, Pitch 1.27 mm; Supplier 1: Digi-Key; Supplier Part Number 1: REF1004C-1.2E4-ND; Supplier 2: Newark; Supplier Part Number 2: 28M6735; Supplier 3: Mouser; Supplier Part Number 3: 595-REF1004C-1.2E4; Eco-Plan: Green (RoHS & no Sb/Br); Temp Coeff(Typ)(ppm/ degree C): 20; Mounting Technology: Surface Mount; Code_JEDEC: MS-012; ComponentLink1Description: Manufacturer URL; ComponentLink1URL: http://www.ti.com/; ComponentLink2Description: Datasheet; ComponentLink2URL: http://www.ti.com/general/docs/lit/getliterature.tsp?genericPartNumber=REF1004-1.2&fileType=pdf; ComponentLink3Description: Package Specification; ComponentLink3URL: http://www.ti.com/litv/pdf/msoi002j
footprint TI-D8_N (SOIC, 8-Leads, Body 4.9x3.9mm, Pitch 1.27mm, IPC Medium Density)
part A pins: 4 ANODE, 6 CATHODE, 8 CATHODE
part B pins: 1 NC, 2 NC, 3 NC, 5 NC, 7 NC

## REF1004C-2.5
designator U?
Micropower Voltage Reference, 2.5 V, 20 ppm / degC, 20 mA, 0 to 70 degC, 8-pin SOIC (D), Green (RoHS & no Sb/Br); Manufacturer: Texas Instruments; PartNumber: REF1004C-2.5; Iout/Iz(Max)(mA): 20; Rating: Catalog; SubFamily: Shunt Voltage Reference; VO(V): 2.5; DatasheetVersion: SBVS002; PackageVersion: 4040047-3/M; PackageReference: D8; PackageDescription: 8-Pin Plastic Small Outline, Body 4.9 x 3.9 mm, Pitch 1.27 mm; Supplier 1: Digi-Key; Supplier Part Number 1: REF1004C-2.5-ND; Supplier 2: Newark; Supplier Part Number 2: 75C7401; Supplier 3: Mouser; Supplier Part Number 3: 595-REF1004C-2.5; Eco-Plan: Green (RoHS & no Sb/Br); Min Iz for Regulation(uA): 20; Temp Coeff(Typ)(ppm/ degree C): 20; Mounting Technology: Surface Mount; Code_JEDEC: MS-012; ComponentLink1Description: Manufacturer URL; ComponentLink1URL: http://www.ti.com/; ComponentLink2Description: Datasheet; ComponentLink2URL: http://www.ti.com/lit/ds/symlink/ref1004-2.5.pdf; ComponentLink3Description: Package Specification; ComponentLink3URL: http://www.ti.com/litv/pdf/msoi002j; ComponentLink4Description: URL Link1; ComponentLink4URL: Samples URL:http://www.ti.com/product/ref1004-2.5
footprint TI-D8_N (SOIC, 8-Leads, Body 4.9x3.9mm, Pitch 1.27mm, IPC Medium Density)
part A pins: 4 ANAODE, 6 CATHODE, 8 CATHODE
part B pins: 1 NC, 2 NC, 3 NC, 5 NC, 7 NC

## REF1004C-2.5/2K5
designator U?
Micropower Voltage Reference, 2.5 V, 20 ppm / degC, 20 mA, 0 to 70 degC, 8-pin SOIC (D), Green (RoHS & no Sb/Br); Manufacturer: Texas Instruments; PartNumber: REF1004C-2.5/2K5; Iout/Iz(Max)(mA): 20; Rating: Catalog; SubFamily: Shunt Voltage Reference; VO(V): 2.5; DatasheetVersion: SBVS002; PackageVersion: 4040047-3/M; PackageReference: D8; PackageDescription: 8-Pin Plastic Small Outline, Body 4.9 x 3.9 mm, Pitch 1.27 mm; Supplier 1: Digi-Key; Supplier Part Number 1: REF1004C-2.5/2K5-ND; Supplier 2: Mouser; Supplier Part Number 2: 595-REF1004C-2.5/2K5; Eco-Plan: Green (RoHS & no Sb/Br); Min Iz for Regulation(uA): 20; Temp Coeff(Typ)(ppm/ degree C): 20; Mounting Technology: Surface Mount; Code_JEDEC: MS-012; ComponentLink1Description: Manufacturer URL; ComponentLink1URL: http://www.ti.com/; ComponentLink2Description: Datasheet; ComponentLink2URL: http://www.ti.com/lit/ds/symlink/ref1004-2.5.pdf; ComponentLink3Description: Package Specification; ComponentLink3URL: http://www.ti.com/litv/pdf/msoi002j; ComponentLink4Description: URL Link1; ComponentLink4URL: Samples URL:http://www.ti.com/product/ref1004-2.5
footprint TI-D8_N (SOIC, 8-Leads, Body 4.9x3.9mm, Pitch 1.27mm, IPC Medium Density)
part A pins: 4 ANAODE, 6 CATHODE, 8 CATHODE
part B pins: 1 NC, 2 NC, 3 NC, 5 NC, 7 NC

## REF1004C-2.5/2K5E4
designator U?
Micropower Voltage Reference, 2.5 V, 20 ppm / degC, 20 mA, 0 to 70 degC, 8-pin SOIC (D), Green (RoHS & no Sb/Br); Manufacturer: Texas Instruments; PartNumber: REF1004C-2.5/2K5E4; Iout/Iz(Max)(mA): 20; Rating: Catalog; SubFamily: Shunt Voltage Reference; VO(V): 2.5; DatasheetVersion: SBVS002; PackageVersion: 4040047-3/M; PackageReference: D8; PackageDescription: 8-Pin Plastic Small Outline, Body 4.9 x 3.9 mm, Pitch 1.27 mm; Supplier 1: Digi-Key; Supplier Part Number 1: REF1004C-2.5/2K5E4-ND; Supplier 2: Newark; Supplier Part Number 2: 28M6736; Supplier 3: Mouser; Supplier Part Number 3: 595-REF1004C252K5E4; Eco-Plan: Green (RoHS & no Sb/Br); Min Iz for Regulation(uA): 20; Temp Coeff(Typ)(ppm/ degree C): 20; Mounting Technology: Surface Mount; Code_JEDEC: MS-012; ComponentLink1Description: Manufacturer URL; ComponentLink1URL: http://www.ti.com/; ComponentLink2Description: Datasheet; ComponentLink2URL: http://www.ti.com/lit/ds/symlink/ref1004-2.5.pdf; ComponentLink3Description: Package Specification; ComponentLink3URL: http://www.ti.com/litv/pdf/msoi002j; ComponentLink4Description: URL Link1; ComponentLink4URL: Samples URL:http://www.ti.com/product/ref1004-2.5
footprint TI-D8_N (SOIC, 8-Leads, Body 4.9x3.9mm, Pitch 1.27mm, IPC Medium Density)
part A pins: 4 ANAODE, 6 CATHODE, 8 CATHODE
part B pins: 1 NC, 2 NC, 3 NC, 5 NC, 7 NC
